# Altium footprint library sun_library.PcbLib: 412 footprints (part 10 of 26)
Each footprint in its own frame and in the unit in brackets; x right, y up, seen from the top. Pads: shape width x height; smd on the part's side, far side on the other; paste and mask are expansions set on the pad; w line width, h text height; cw(c..) or ccw(c..) is an arc to the next point about the centre after c.
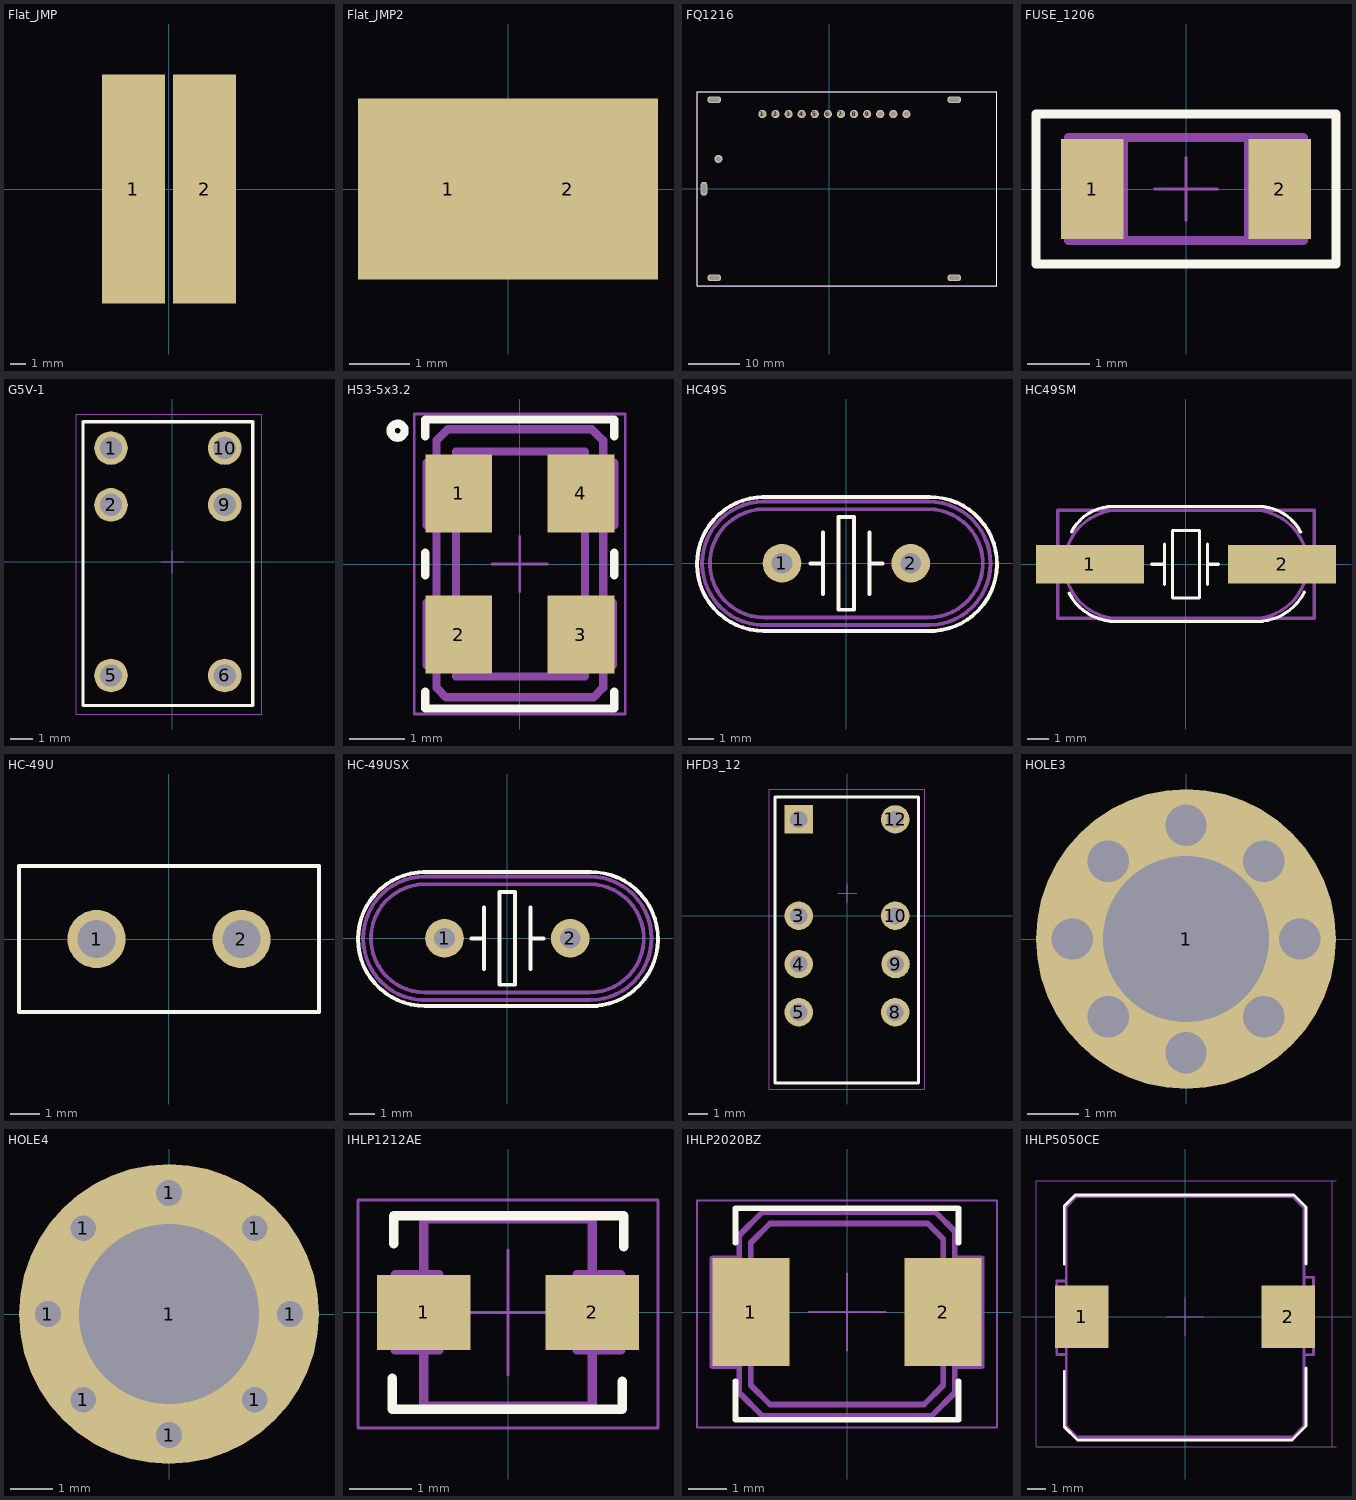
[diagram p9: the footprints below, top view; thin cyan lines are the x and y axes]

## Flat_JMP [mm] "Площадки 14.5x8.5mm, зазор 0.5mm"
pads (2):
  rect 4x14.5 smd: 1(-2.25,0) 2(2.25,0)

## Flat_JMP2 [mm] "Площадки 14.5x8.5mm, зазор 0.5mm"
pads (2):
  rect 3x3 smd: 1(-0.988,0) 2(0.987,0)

## FQ1216 [mm]
pads (18):
  round 1.6 hole 1: 1(-12.94,14.5) 2(-10.4,14.5) 3(-7.86,14.5) 4(-5.32,14.5) 5(-2.78,14.5) 6(-0.24,14.5) 7(2.3,14.5) 8(4.84,14.5) 9(7.38,14.5) 10(9.92,14.5) 11(12.46,14.5) 12(15,14.5) 13(-21.5,5.8)
  oval 1.3x2.7 hole 0.8 slot 2 at 90 deg: 14(-24.3,0)
  oval 2.7x1.3 hole 0.8 slot 2 at 0 deg: 14(-22.3,17.3) 15(24.3,17.3) 16(-22.3,-17.3) 17(24.3,-17.3)
Top Overlay:
  lines w0.15: -25.6,-18.8 32.6,-18.8 32.6,18.8 -25.6,18.8 -25.6,-18.8
TopAssy 13:
  lines w0.15: -25.6,-18.9 32.6,-18.9 32.6,18.8 -25.6,18.8 -25.6,-18.9
3D body: height 7, standoff 0, extent -25.613,-18.913 32.613,18.813

## FUSE_1206 [mm]
pads (2):
  rect 1x1.6 smd: 1(-1.5,0) 2(1.5,0)
Top Overlay:
  lines w0.15: -2.4,-1.2 2.4,-1.2 2.4,1.2 -2.4,1.2 -2.4,-1.2
TopAssy 13:
  lines w0.15: -1,-0.825 -1,0.825 ; 1,-0.825 1,0.825 ; -1.875,-0.825 1.875,-0.825 1.875,-0.413 1.7,-0.238 1.7,0.237 1.875,0.412 1.875,0.825 -1.875,0.825 -1.875,0.412 -1.7,0.237 -1.7,-0.238 -1.875,-0.413 -1.875,-0.825
CourtTop 15:
  lines w0.05: -0.5,0 0.5,0 ; 0,-0.5 0,0.5 ; -2.4,-1.2 -2.4,1.2 2.4,1.2 2.4,-1.2 -2.4,-1.2
3D body "User Library-MF-NSMF.STEP": height 0.52, standoff 0.02, extent -1.7,-0.85 1.7,0.85

## G5V-1 [mm] "Реле серии G5V-1 производитель OMRON"
height 11.8
pads (6):
  round 1.5 hole 1: 1(-2.74,5.08) 2(-2.74,2.54) 5(-2.74,-5.08) 6(2.34,-5.08) 9(2.34,2.54) 10(2.34,5.08)
Top Overlay:
  lines w0.15: -3.99,-6.42 3.585,-6.42 3.585,6.255 -3.99,6.255 -3.99,-6.42
CourtTop 15:
  lines w0.05: -0.5,0 0.5,0 ; 0,-0.5 0,0.5 ; -4.3,-6.8 -4.3,6.6 4,6.6 4,-6.8 -4.3,-6.8
3D body "User Library-G5V-1.step": height 10, standoff -3, extent -3.915,-6.295 3.585,6.205

## H53-5x3.2 [mm] "CLOCK OSCILLATORS Logic: HCMOS  “H53” series 5x3.2 mm"
height 1.2
pads (4):
  rect 1.2x1.4 smd: 1(-1.1,1.27) 2(-1.1,-1.27) 3(1.1,-1.27) 4(1.1,1.27)
Top Overlay:
  circle w0.15: c-2.2,2.4 r0.125
  lines w0.15: -1.7,-2.3 -1.7,-2.6 1.7,-2.6 1.7,-2.3 ; -1.7,-0.2 -1.7,0.2 ; -1.7,2.3 -1.7,2.6 1.7,2.6 1.7,2.3 ; 1.7,-0.2 1.7,0.2
TopAssy 13:
  lines w0.15: -1.5,-1.825 -1.675,-1.825 -1.675,-0.7 -1.5,-0.7 ; -1.5,0.7 -1.675,0.7 -1.675,1.825 -1.5,1.825 ; 1.5,-1.825 1.675,-1.825 1.675,-0.7 1.5,-0.7 ; 1.525,0.7 1.7,0.7 1.7,1.825 1.525,1.825 ; -1.5,-2.225 -1.5,2.225 -1.3,2.425 1.3,2.425 1.5,2.225 1.5,-2.225 1.325,-2.4 -1.325,-2.4 -1.5,-2.225 ; -1.15,-2.025 1.175,-2.025 1.175,2.025 -1.15,2.025 -1.15,-2.025
CourtTop 15:
  lines w0.05: -0.5,0 0.5,0 ; 0,-0.5 0,0.5 ; -1.9,-2.7 1.9,-2.7 1.9,2.7 -1.9,2.7 -1.9,-2.7
3D body "User Library-H53-5x3_2.step": height 1.22, standoff 0, extent -1.6,-2.5 1.6,2.5

## HC49S [mm]
pads (2):
  round 1.5 hole 0.8: 1(-2.5,0) 2(2.5,0)
Top Overlay:
  lines w0.15: -3.25,2.575 3.225,2.575 ; -3.225,-2.625 3.425,-2.625 ; -3.2,-2.625 cw(c-3.2,-0.025) -3.2,2.575 ; -1.4,0 -0.9,0 ; -0.9,-1.2 -0.9,1.2 ; 0.9,-1.2 0.9,1.2 ; 0.9,0 1.4,0 ; 3.193,2.576 cw(c3.25,-0.025) 3.405,-2.622 ; -0.3,-1.8 -0.3,1.8 0.3,1.8 0.3,-1.8 -0.3,-1.8
TopAssy 13:
  lines w0.15: -3.3,-2.4 3.2,-2.4 ccw(c3.2,0) 3.2,2.4 -3.2,2.4 ccw(c-3.2,0) -3.2,-2.4 ; -3.2,-2.1 cw(c-3.2,0) -3.2,2.1 3.2,2.1 cw(c3.2,0) 3.2,-2.1 -3.2,-2.1
3D body "HP49US.step": height 3.5, standoff -4, extent -5.75,-2.375 5.6,2.275

## HC49SM [mm]
pads (2):
  rect 5x1.8 smd: 1(-4.45,0) 2(4.45,0)
Top Overlay:
  lines w0.15: -5.423,-1.332 ccw(c-3.25,-0.2) -3.25,-2.65 3.285,-2.65 ccw(c3.285,-0.193) 5.478,-1.301 ; -5.306,1.494 cw(c-3.386,0.523) -3.386,2.675 3.371,2.675 cw(c3.371,0.488) 5.311,1.498 ; -1.6,0 -1.1,0 ; -1,-0.937 -1,0.937 ; 1,-0.937 1,0.937 ; 1,0 1.5,0 ; -0.625,-1.562 0.625,-1.562 0.625,1.562 -0.625,1.562 -0.625,-1.562
TopAssy 13:
  lines w0.15: -5.937,-0.625 -6.25,-0.625 -6.25,0.625 -5.937,0.625 ; -3.125,-2.5 cw(c-3.125,0) -3.125,2.5 ; 3.125,-2.5 ccw(c3.125,0) 3.125,2.5 ; 5.938,-0.625 6.25,-0.625 6.25,0.625 5.938,0.625 ; -5.937,-2.5 -5.937,2.5 5.938,2.5 5.938,-2.5 -5.937,-2.5
3D body "SW3dPS-hc49_cystal.STEP": height 5.08, standoff 0, extent -6.75,-2.3 6.65,2.6

## HC-49U [mm] "Кварцевый резонатор типа HC-49/U"
pads (2):
  round 2.01 hole 1.3: 1(-2.5,0) 2(2.5,0)
Top Overlay:
  lines w0.15: 5.175,2.52 5.175,-2.52 -5.175,-2.52 -5.175,2.522 5.175,2.522
3D body "HC49U.STEP": height 13.46, standoff -2, extent -5.472,-2.336 5.7,2.336

## HC-49USX [mm] "Quartz Crystal ECS-92.1-18-4XEN"
height 3.5
pads (2):
  round 1.5 hole 0.8: 1(-2.44,0) 2(2.44,0)
Top Overlay:
  lines w0.15: -3.25,2.575 3.225,2.575 ; -3.2,-2.625 cw(c-3.2,-0.025) -3.2,2.575 ; -3.165,-2.625 3.485,-2.625 ; -1.4,0 -0.9,0 ; -0.9,-1.2 -0.9,1.2 ; 0.9,-1.2 0.9,1.2 ; 0.9,0 1.4,0 ; 3.193,2.576 cw(c3.25,-0.025) 3.405,-2.622 ; -0.3,-1.8 -0.3,1.8 0.3,1.8 0.3,-1.8 -0.3,-1.8
TopAssy 13:
  lines w0.15: -3.3,-2.4 3.2,-2.4 ccw(c3.2,0) 3.2,2.4 -3.2,2.4 ccw(c-3.2,0) -3.2,-2.4 ; -3.2,-2.1 cw(c-3.2,0) -3.2,2.1 3.2,2.1 cw(c3.2,0) 3.2,-2.1 -3.2,-2.1
3D body "User Library-HC-49_LT_THT_16MHz.step": height 3.6, standoff -1.99, extent -5.665,-2.325 5.685,2.325

## HFD3_12 [mm] "Relay HFD3/12"
pads (8):
  rect 1.5x1.5 hole 0.9: 1(-2.55,5.08)
  round 1.5 hole 0.9: 3(-2.55,0) 4(-2.55,-2.54) 5(-2.55,-5.08) 8(2.53,-5.08) 9(2.55,-2.54) 10(2.53,0) 12(2.53,5.08)
Top Overlay:
  lines w0.15: -3.8,-8.798 -3.8,6.257 3.763,6.257 3.763,-8.798 -3.8,-8.798
CourtTop 15:
  lines w0.05: -0.5,1.18 0.5,1.18 ; 0,0.68 0,1.68 ; -4.1,-9.123 4.085,-9.123 4.085,6.68 -4.1,6.68 -4.1,-9.123
3D body "hfd3.stp": height 8.96, standoff -3.35, extent -3.718,-8.72 3.682,6.18

## HOLE3 [mm]
pads (1):
  round 5.8 hole 3.2: 1(0,0)
via 2.2,0 diameter 1.2 hole 0.8
via 1.5,1.5 diameter 1.2 hole 0.8
via 0,2.2 diameter 1.2 hole 0.8
via -1.5,1.5 diameter 1.2 hole 0.8
via -2.2,0 diameter 1.2 hole 0.8
via -1.5,-1.5 diameter 1.2 hole 0.8
via 0,-2.2 diameter 1.2 hole 0.8
via 1.5,-1.5 diameter 1.2 hole 0.8

## HOLE4 [mm]
pads (9):
  round 1 hole 0.6: 1(-2.825,0) 1(-2,-2) 1(-2,2) 1(0,-2.825) 1(0,2.825) 1(2,-2) 1(2,2) 1(2.825,0)
  round 7 hole 4.2: 1(0,0)

## IHLP1212AE [mm] "SMT power inductors, Low DCR Series"
height 1.6
pads (2):
  rect 1.5x1.2 smd: 1(-1.35,0) 2(1.35,0)
Top Overlay:
  lines w0.15: -1.851,-1.05 -1.851,-1.55 1.826,-1.55 1.826,-1.1 ; -1.826,1.1 -1.826,1.55 1.851,1.55 1.851,1.05
TopAssy 13:
  lines w0.15: -1.804,-0.6 -1.804,0.6 -1.104,0.6 -1.104,-0.6 -1.804,-0.6 ; -1.35,-1.5 1.35,-1.5 1.35,1.5 -1.35,1.5 -1.35,-1.5 ; 1.104,-0.6 1.804,-0.6 1.804,0.6 1.104,0.6 1.104,-0.6
CourtTop 15:
  lines w0.05: -1,0 1,0 ; 0,-1 0,1 ; -2.4,-1.85 -2.4,1.8 2.4,1.8 2.4,-1.85 -2.4,-1.85
3D body "User Library-IHLP1212.step": height 2.06, standoff 0.02, extent -1.825,-1.497 1.832,1.5

## IHLP2020BZ [mm] "SMT power inductors, IHLP2020BZseries"
height 2
pads (2):
  rect 2x2.8 smd: 1(-2.5,0) 2(2.5,0)
Top Overlay:
  lines w0.15: -2.9,-1.8 -2.9,-2.8 2.9,-2.8 2.9,-1.8 ; -2.9,1.8 -2.9,2.7 2.9,2.7 2.9,1.8
TopAssy 13:
  lines w0.15: -2.8,-1.4 -3.5,-1.4 -3.5,1.4 -2.8,1.4 ; 2.8,-1.4 3.5,-1.4 3.5,1.4 2.8,1.4 ; -2.8,-2.1 -2.2,-2.7 2.2,-2.7 2.8,-2.1 2.8,2.1 2.3,2.6 -2.2,2.6 -2.8,2 -2.8,-2.1 ; -2.5,-1.9 -2,-2.4 2,-2.4 2.5,-1.9 2.5,1.9 2.1,2.3 -2,2.3 -2.5,1.8 -2.5,-1.9
CourtTop 15:
  lines w0.05: -1,0 1,0 ; 0,-1 0,1 ; -3.9,-3 -3.9,2.9 3.9,2.9 3.9,-3 -3.9,-3
3D body "User Library-IHLP2020CZ.step": height 3, standoff 0, extent -2.724,-2.665 2.776,2.535

## IHLP5050CE [mm] "SMT power inductors, IHLP5050CE series Vishay"
height 6.2
pads (2):
  rect 2.85x3.3 smd paste-2: 1(-5.475,0) 2(5.475,0)
Top Overlay:
  lines w0.15: -6.4,-2.9 -6.4,-5.833 -5.707,-6.527 5.677,-6.527 6.41,-5.794 6.41,-2.711 ; -6.4,2.8 -6.4,5.874 -5.819,6.454 5.774,6.454 6.41,5.819 6.41,2.789
Top Paste:
  region: -4.05,-0.3 -6.9,-0.3 -6.9,-1.65 -4.05,-1.65
  region: -4.05,1.65 -6.9,1.65 -6.9,0.3 -4.05,0.3
  rectangle: 4.05,-1.65 6.9,-0.3
  rectangle: 4.05,0.3 6.9,1.65
TopAssy 13:
  lines w0.15: -6.3,-2 -6.8,-2 -6.8,1.9 -6.3,1.9 ; 6.31,-2.011 6.81,-2.011 6.81,2.089 6.31,2.089 ; -6.3,-5.811 -5.734,-6.378 5.714,-6.378 6.31,-5.782 6.31,5.775 5.706,6.378 -5.753,6.378 -6.3,5.831 -6.3,-5.811
CourtTop 15:
  lines w0.05: -1,0 1,0 ; 0,-1 0,1 ; 7.81,-6.911 7.81,7.189 ; 8,-6.9 -7.9,-6.9 -7.9,7.2 8,7.2
3D body "IHLP5050CE (0.68-10uH).STEP": height 3.4, standoff 0.01, extent -6.581,-6.378 6.581,6.378